# Altium footprint library My Library.PcbLib: 872 footprints (part 5 of 55)
Each footprint in its own frame and in the unit in brackets; x right, y up, seen from the top. Pads: shape width x height; smd on the part's side, far side on the other; paste and mask are expansions set on the pad; w line width, h text height; cw(c..) or ccw(c..) is an arc to the next point about the centre after c.
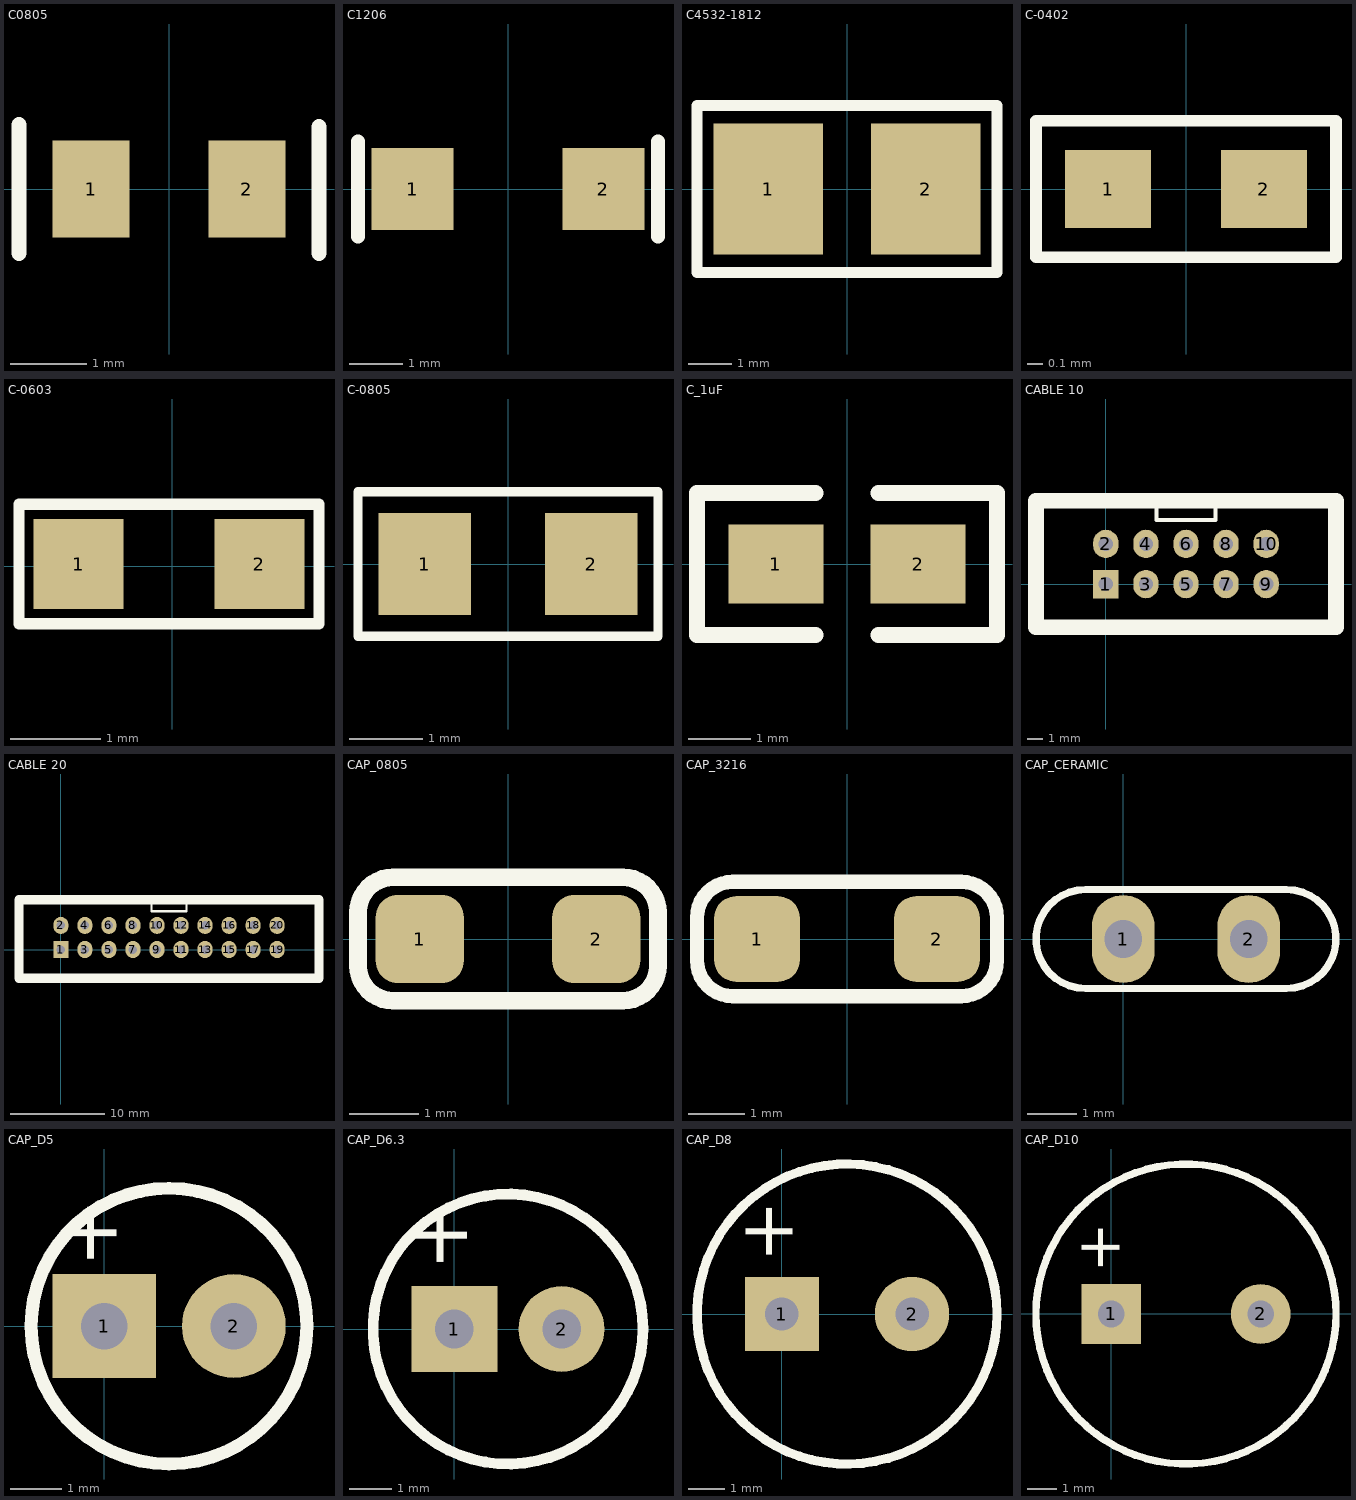
[diagram p4: the footprints below, top view; thin cyan lines are the x and y axes]

## C0805 [mm] "Chip Resistor; Body 2.0 x 1.3 mm (LxW typ)"
height 2.54
pads (2):
  rect 1x1.27 smd: 1(-1.016,0) 2(1.016,0)
Top Overlay:
  lines w0.2: -1.956,-0.838 -1.956,0.838 ; 1.956,-0.838 1.956,0.813
3D body "User Library-0805 SMD Capacitor.step": height 0.78, standoff 0, extent -1,-0.625 1,0.625

## C1206 [mil]
pads (2):
  rect 60x60 smd: 1(-70,0) 2(70,0)
Top Overlay:
  lines w10: -110,-35 -110,35 ; 110,-35 110,35
3D body "User Library-1206 SMD Capacitor.step": height 39.45, standoff 0, extent -62.99,-31.49 63,31.5
3D body: height 40, standoff 0, extent -35,-35 35,35

## C4532-1812 [mm]
pads (2):
  rect 2.5x3 smd: 1(-1.8,0) 2(1.8,0)
Top Overlay:
  lines w0.254: -3.429,-1.905 -3.429,1.905 3.429,1.905 3.429,-1.905 -3.429,-1.905
3D body: height 2.5, standoff 0, extent -1.905,-1.524 1.905,1.524
3D body: height 2.5, standoff 0, extent -2.286,-1.524 -1.905,1.524
3D body: height 2.5, standoff 0, extent 1.905,-1.524 2.286,1.524

## C-0402 [mil]
pads (2):
  rect 22x20 smd: 1(-20,0) 2(20,0)
Top Overlay:
  lines w3: -38.5,-17.5 38.5,-17.5 38.5,17.5 -38.5,17.5 -38.5,-17.5
3D body "User Library-cap_0402.STEP": height 19.68, standoff 0, extent -19.68,-9.84 19.69,9.85

## C-0603 [mm] "Chip Capacitor; Body 1.6 x 0.8 mm (LxW typ)"
height 0.87
pads (2):
  rect 1x1 smd: 1(-1.041,0.025) 2(0.965,0.025)
Top Overlay:
  lines w0.127: -1.702,-0.635 1.626,-0.635 1.626,0.686 -1.702,0.686 -1.702,-0.635
3D body "User Library-SMD CAPACITOR.STEP": height 0.8, standoff 0, extent -0.822,-0.376 0.778,0.424

## C-0805 [mil] "Compoment SMD 80x50mil"
height 50
pads (2):
  rect 50x55 smd: 1(-45,0) 2(45,0)
Top Overlay:
  lines w5: -81,-39 -81,39 81,39 81,-39 -81,-39
3D body "SW3dPS-smt_resistor_packages.STEP": height 24.02, standoff -0.39, extent -39.76,-25 39.76,25

## C_1uF [mil]
pads (2):
  rect 60x50 smd: 1(-45,0) 2(45,0)
Top Overlay:
  lines w10: -20,-45 -95,-45 -95,45 -20,45 ; 20,-45 95,-45 95,45 20,45
3D body: height 51.18, standoff 0, extent 25,-25 45,25
3D body: height 51.18, standoff 0, extent -45,-25 -25,25
3D body: height 51.18, standoff 0, extent -25,-25 25,25

## CABLE 10 [mm] "Connector; Header; 5x2 Position"
pads (10):
  rect 1.6x1.8 hole 0.9: 1(0,0)
  oval 1.6x1.8 hole 0.9: 2(0,2.54) 3(2.54,0) 4(2.54,2.54) 5(5.08,0) 6(5.08,2.54) 7(7.62,0) 8(7.62,2.54) 9(10.16,0) 10(10.16,2.54)
Top Overlay:
  lines w0.254: 3.226,5.27 3.226,4.064 5.08,4.064 6.934,4.064 6.934,5.27
  lines w1: -4.42,-2.73 14.58,-2.73 14.58,5.27 -4.42,5.27 -4.42,-2.73
3D body "User Library-Tyco - 5103308-1 (Shrouded Header 2_54mm 10 Pin).step": height 9.86, standoff -3.05, extent -5.08,-3.302 15.24,5.842

## CABLE 20 [mm] "Connector; Header; 5x2 Position"
pads (20):
  rect 1.6x1.8 hole 0.9: 1(0,0)
  oval 1.6x1.8 hole 0.9: 2(0,2.54) 3(2.54,0) 4(2.54,2.54) 5(5.08,0) 6(5.08,2.54) 7(7.62,0) 8(7.62,2.54) 9(10.16,0) 10(10.16,2.54) 11(12.7,0) 12(12.7,2.54) 13(15.24,0) 14(15.24,2.54) 15(17.78,0) 16(17.78,2.54) 17(20.32,0) 18(20.32,2.54) 19(22.86,0) 20(22.86,2.54)
Top Overlay:
  lines w0.254: 9.576,5.27 9.576,4.064 11.43,4.064 13.284,4.064 13.284,5.27
  lines w1: 8.28,-3.048 27.28,-3.048 27.28,5.27 8.28,5.27 ; 14.58,-3.048 -4.42,-3.048 -4.42,5.27 14.58,5.27
3D body "User Library-HDB-20.step": height 9.3, standoff -2.5, extent -5.02,-3.63 27.88,5.77

## CAP_0805 [mm]
height 1.27
pads (2):
  rrect50% 1.27x1.27 smd: 1(-1.27,0) 2(1.27,0)
Top Overlay:
  lines w0.254: -2.159,-0.381 ccw(c-1.651,-0.381) -1.651,-0.889 1.651,-0.889 ccw(c1.651,-0.381) 2.159,-0.381 2.159,0 2.159,0.381 ccw(c1.651,0.381) 1.651,0.889 -1.651,0.889 ccw(c-1.651,0.381) -2.159,0.381 -2.159,-0.381
3D body "SW3dPS-smt_resistor_packages.STEP": height 0.61, standoff -0.01, extent -1.01,-0.635 1.01,0.635

## CAP_3216 [mil]
pads (2):
  rrect50% 60x60 smd: 1(-62.99,0) 2(62.99,0)
Top Overlay:
  lines w10: -105,-15 ccw(c-80,-15) -80,-40 80,-40 ccw(c80,-15) 105,-15 105,15 ccw(c80,15) 80,40 -80,40 ccw(c-80,15) -105,15 -105,-15
3D body "User Library-CAPC3216X10.STEP": height 39.37, standoff 0, extent -62.99,-31.5 62.99,31.5

## CAP_CERAMIC [mil] "Tu gom mini"
pads (2):
  oval 50x70 hole 30: 1(0,0) 2(100,0)
Top Overlay:
  lines w5.91: -30,-39.37 cw(c-30,0) -30,39.37 130,39.37 cw(c130,0) 130,-39.37 -30,-39.37
3D body "User Library-Cap 100n.step": height 240.98, standoff -70.87, extent -64.86,-33.39 165,33.4

## CAP_D5 [mil]
pads (2):
  rect 80x80 hole 36: 1(0,0)
  round 80 hole 36: 2(100,0)
Top Overlay:
  circle w10: c50,0 r106.3
  text "+" at 25,45 h80
3D body "User Library-CapAluRadial_D50H110.STEP": height 541.5, standoff -108.11, extent -58.27,-108.25 158.27,108.24

## CAP_D6.3 [mil]
pads (2):
  rect 80x80 hole 36: 1(0,0)
  round 80 hole 36: 2(100,0)
Top Overlay:
  circle w10: c50,0 r125.98
  text "+" at 31,54 h100
3D body "User Library-CapAluRadial_D63H110.STEP": height 492.13, standoff -118.11, extent -83.87,-133.87 183.85,133.85

## CAP_D8 [mil]
pads (2):
  rect 80x80 hole 36: 1(0,0)
  round 80 hole 36: 2(140,0)
Top Overlay:
  circle w10: c70,0 r161.42
  text "+" at 31,55 h100
3D body "User Library-CapAluRadial_D80H115.STEP": height 511.81, standoff -118.11, extent -97.33,-167.31 237.32,167.29

## CAP_D10 [mil]
pads (2):
  rect 80x80 hole 36: 1(0,0)
  round 80 hole 36: 2(200,0)
Top Overlay:
  circle w10: c99.99,-0.01 r200.79
  text "+" at 31,55 h100
3D body "User Library-CapAluRadial_D100H125.STEP": height 551.18, standoff -118.11, extent -106.7,-206.67 306.69,206.66